# Altium footprint library standard.PcbLib: 229 footprints (part 10 of 15)
Each footprint in its own frame and in the unit in brackets; x right, y up, seen from the top. Pads: shape width x height; smd on the part's side, far side on the other; paste and mask are expansions set on the pad; w line width, h text height; cw(c..) or ccw(c..) is an arc to the next point about the centre after c.
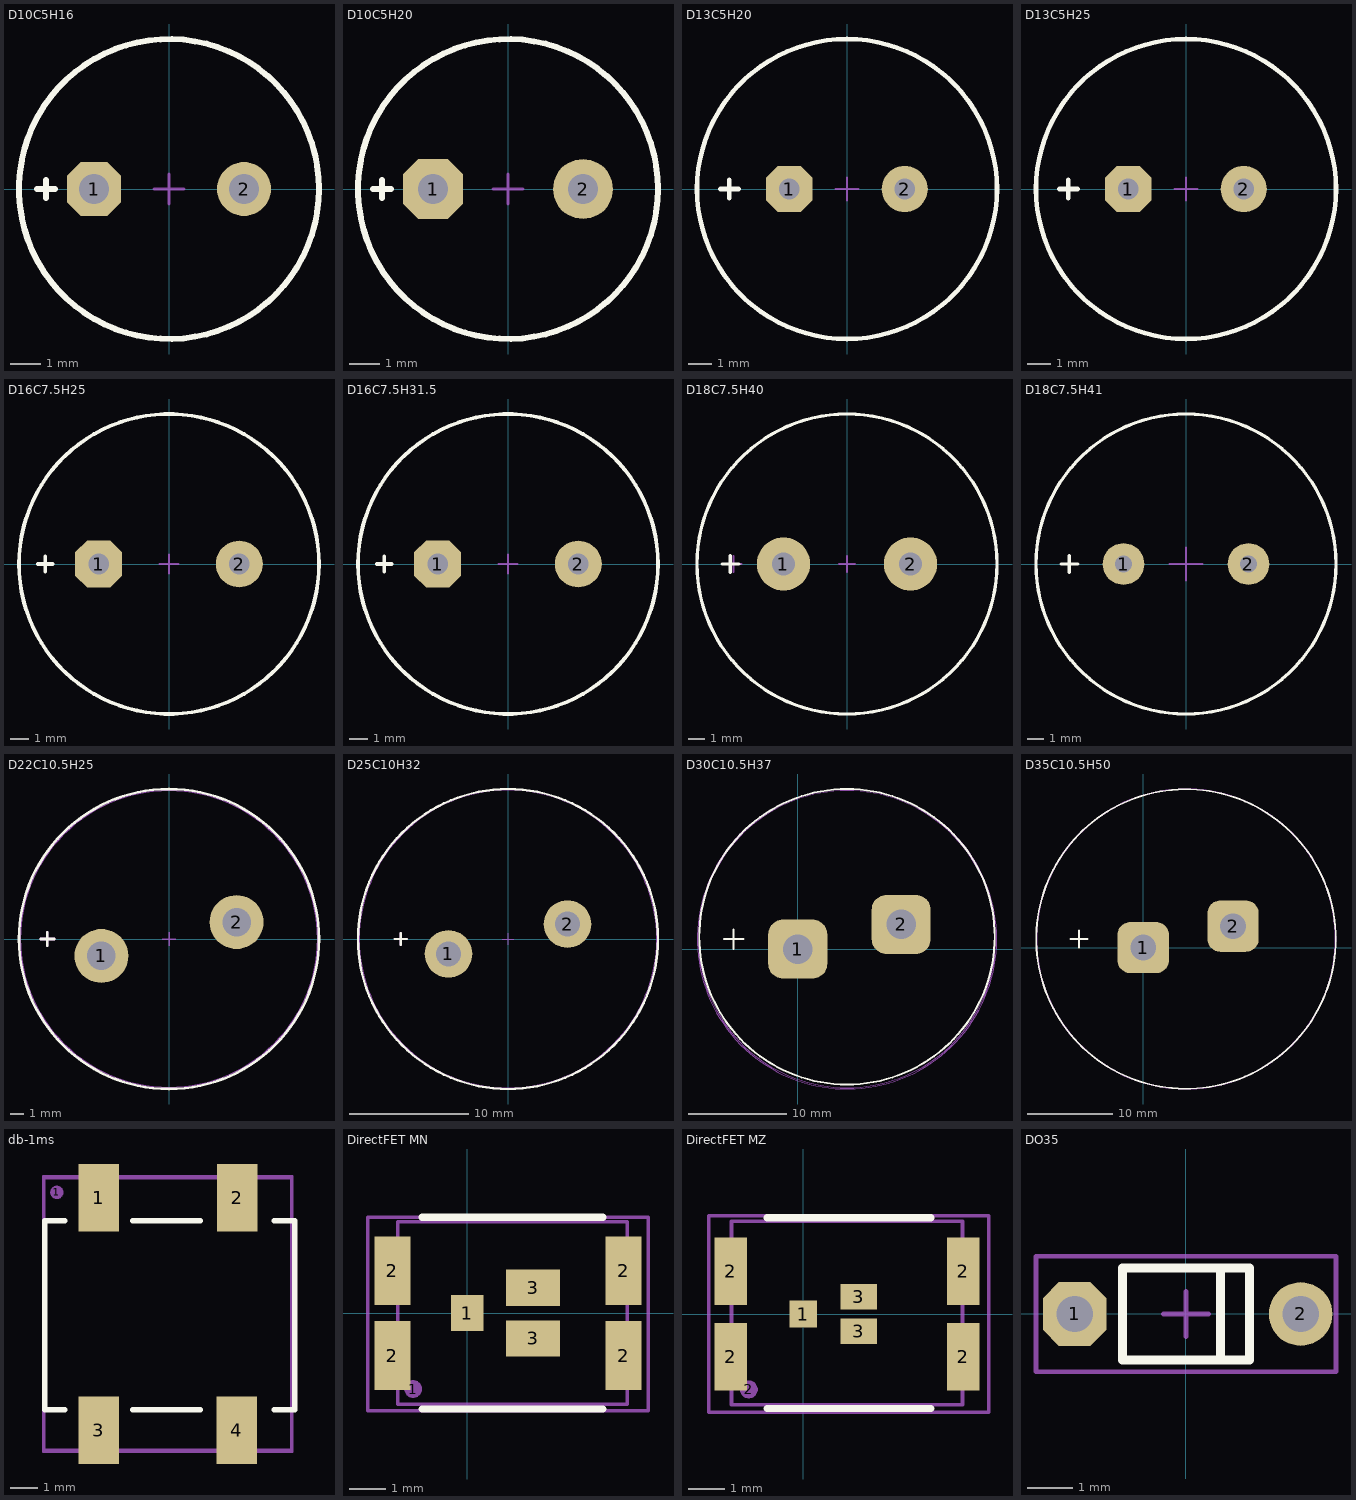
[diagram p9: the footprints below, top view; thin cyan lines are the x and y axes]

## D10C5H16 [mm] "Polar capacitor, diameter 10 mm, leads clearance 5 mm, height 16 mm"
height 16
pads (2):
  oct 1.8x1.8 hole 1: 1(-2.5,0)
  round 1.8 hole 1: 2(2.5,0)
Top Overlay:
  circle w0.2: c0,0 r5
  lines w0.2: -4.4,0 -3.8,0 ; -4.1,-0.3 -4.1,0.3
Mechanical 1:
  circle w0.1: c0,0 r5
Mechanical 15:
  circle w0.1: c0,0 r5
  lines w0.1: -0.5,0 0.5,0 ; 0,-0.5 0,0.5
3D body "User Library-CapAluRadial_D100H160.STEP": height 17.5, standoff -3, extent -5.25,-5.249 5.25,5.249

## D10C5H20 [mm] "Polar capacitor, diameter 10 mm, leads clearance 5 mm, height 20 mm"
height 20
pads (2):
  oct 2x2 hole 1: 1(-2.5,0)
  round 2 hole 1: 2(2.5,0)
Top Overlay:
  circle w0.2: c0,0 r5
  lines w0.2: -4.5,0 -3.9,0 ; -4.2,-0.3 -4.2,0.3
Mechanical 1:
  circle w0.1: c0,0 r5
Mechanical 15:
  circle w0.1: c0,0 r5
  lines w0.1: -0.5,0 0.5,0 ; 0,-0.5 0,0.5
3D body "User Library-CapAluRadial_D100H200.STEP": height 22, standoff -3, extent -5.25,-5.249 5.25,5.249

## D13C5H20 [mm] "Polar capacitor, diameter 13 mm, leads clearance 5 mm, height 20 mm"
height 20
pads (2):
  oct 2x2 hole 0.9: 1(-2.5,0)
  round 2 hole 0.9: 2(2.5,0)
Top Overlay:
  circle w0.2: c0,0 r6.5
  lines w0.2: -5.5,0 -4.7,0 ; -5.1,-0.4 -5.1,0.4
Mechanical 1:
  circle w0.1: c0,0 r6.5
Mechanical 15:
  circle w0.1: c0,0 r6.5
  lines w0.1: -0.5,0 0.5,0 ; 0,-0.5 0,0.5
3D body "User Library-Cap-EL(13x25-5).STEP": height 25, standoff -3.3, extent -6.5,-6.499 6.502,6.499

## D13C5H25 [mm] "Polar capacitor, diameter 13 mm, leads clearance 5 mm, height 25 mm"
height 25
pads (2):
  oct 2x2 hole 0.9: 1(-2.5,0)
  round 2 hole 0.9: 2(2.5,0)
Top Overlay:
  circle w0.2: c0,0 r6.5
  lines w0.2: -5.5,0 -4.7,0 ; -5.1,-0.4 -5.1,0.4
Mechanical 1:
  circle w0.1: c0,0 r6.5
Mechanical 15:
  circle w0.1: c0,0 r6.5
  lines w0.1: -0.5,0 0.5,0 ; 0,-0.5 0,0.5
3D body "User Library-Cap-EL(13x25-5).STEP": height 25, standoff -3.3, extent -6.5,-6.499 6.502,6.499

## D16C7.5H25 [mm] "Polar capacitor, diameter 16 mm, leads clearance 7.5 mm, height 25 mm"
height 25
pads (2):
  oct 2.5x2.5 hole 1.1: 1(-3.75,0)
  round 2.5 hole 1.1: 2(3.75,0)
Top Overlay:
  circle w0.2: c0,0 r8
  lines w0.2: -7,0 -6.2,0 ; -6.6,-0.4 -6.6,0.4
Mechanical 1:
  circle w0.1: c0,0 r8
Mechanical 15:
  circle w0.1: c0,0 r8
  lines w0.1: -0.5,0 0.5,0 ; 0,-0.5 0,0.5
3D body "User Library-CapAluRadial_D160H250.STEP": height 27, standoff -3, extent -8.25,-8.249 8.25,8.249

## D16C7.5H31.5 [mm] "Polar capacitor, diameter 16 mm, leads clearance 7.5 mm, height 31.5 mm"
height 31.5
pads (2):
  oct 2.5x2.5 hole 1.1: 1(-3.75,0)
  round 2.5 hole 1.1: 2(3.75,0)
Top Overlay:
  circle w0.2: c0,0 r8
  lines w0.2: -7,0 -6.2,0 ; -6.6,-0.4 -6.6,0.4
Mechanical 1:
  circle w0.1: c0,0 r8
Mechanical 15:
  circle w0.1: c0,0 r8
  lines w0.1: -0.5,0 0.5,0 ; 0,-0.5 0,0.5
3D body "User Library-CapAluRadial_D160H315.STEP": height 33.5, standoff -3, extent -8.25,-8.25 8.25,8.249

## D18C7.5H40 [mm]
height 40
pads (2):
  round 3.2 hole 1.4: 1(-3.81,0) 2(3.81,0)
Top Overlay:
  circle w0.2: c0,0 r9
  lines w0.2: -7.5,0 -6.5,0 ; -7,-0.5 -7,0.5
Mechanical 1:
  circle w0.1: c0,0 r9
  lines w0.1: -7.31,0 -6.31,0 ; -6.81,-0.5 -6.81,0.5
Mechanical 15:
  circle w0.1: c0,0 r9
  lines w0.1: -0.5,0 0.5,0 ; 0,-0.5 0,0.5
3D body "User Library-Cap-EL(18x40-7_5)T.STEP": height 41, standoff -3, extent -9,-8.999 9.002,9

## D18C7.5H41 [mm] "Polar capacitor, diameter 16 mm, leads clearance 7.5 mm, height 31.5 mm"
height 31.5
pads (2):
  round 2.5 hole 1: 1(-3.75,0) 2(3.75,0)
Top Overlay:
  circle w0.2: c0,0 r9
  lines w0.2: -7.5,0 -6.5,0 ; -7,-0.5 -7,0.5
Mechanical 1:
  circle w0.1: c0,0 r9
Mechanical 15:
  circle w0.1: c0,0 r9
  lines w0.1: -1,0 1,0 ; 0,-1 0,1
3D body "Cap electrolitic radial 18x41.STEP": height 41.3, standoff -1.2, extent -8.997,-8.999 8.997,9

## D22C10.5H25 [mm]
height 25
pads (2):
  round 4 hole 2.1: 1(-5,-1.25) 2(5,1.25)
Top Overlay:
  circle w0.2: c0,0 r11.1
  lines w0.2: -9.5,0 -8.5,0 ; -9,-0.5 -9,0.5
Mechanical 1:
  circle w0.1: c0,0 r11
  lines w0.2: -9.5,0 -8.5,0 ; -9,-0.5 -9,0.5
Mechanical 15:
  circle w0.1: c0,0 r11
  lines w0.1: -0.5,0 0.5,0 ; 0,-0.5 0,0.5
3D body "User Library-ECEC2DP271BJ.STEP": height 25, standoff 0, extent -11,-11 11,11

## D25C10H32 [mm]
height 25
pads (2):
  round 4 hole 2.1: 1(-5,-1.25) 2(5,1.25)
Top Overlay:
  circle w0.2: c0,0 r12.6
  lines w0.2: -9.5,0 -8.5,0 ; -9,-0.5 -9,0.5
Mechanical 1:
  circle w0.1: c0,0 r12.5
  lines w0.2: -9.5,0 -8.5,0 ; -9,-0.5 -9,0.5
Mechanical 15:
  circle w0.1: c0,0 r12.5
  lines w0.1: -0.5,0 0.5,0 ; 0,-0.5 0,0.5
3D body "D25H32.STEP": height 37.87, standoff 0.06, extent -13,-13 13,12.991

## D30C10.5H37 [mm]
height 37
pads (2):
  rrect50% 6x6 hole 3: 1(0,0) 2(10.5,2.5)
Top Overlay:
  circle w0.2: c5,1.25 r15
  lines w0.2: -7.5,1 -5.5,1 ; -6.5,0 -6.5,2
Mechanical 1:
  circle w0.1: c5,1 r15.207
  lines w0.1: -7.5,1 -5.5,1 ; -6.5,0 -6.5,2
Mechanical 15:
  circle w0.1: c5,1 r15.075
3D body "User Library-Assy_CE_R400_D1200_H1450.STEP": height 36.83, standoff -6.89, extent -12.7,-16.473 22.61,18.836

## D35C10.5H50 [mm]
height 50
pads (2):
  rrect50% 6x6 hole 3: 1(0,0) 2(10.5,2.5)
Top Overlay:
  circle w0.2: c5,1 r17.5
  lines w0.2: -8.5,1 -6.5,1 ; -7.5,0 -7.5,2
Mechanical 1:
  circle w0.1: c5,1 r17.464
  lines w0.1: -8.5,1 -6.5,1 ; -7.5,0 -7.5,2
Mechanical 15:
  circle w0.1: c5,1 r17.529
3D body "User Library-el_cap_470uF-400V.STEP": height 46.7, standoff -3.5, extent -15.756,-19.756 25.756,21.756

## db-1ms [mm]
pads (5):
  round 0.5 on Mech1: 1(3.2,-3.2)
  rect 1.5x2.5 smd: 1(4.75,-3.4) 2(9.875,-3.4) 3(4.75,-12) 4(9.85,-12)
Top Overlay:
  lines w0.2: 3.5,-11.25 2.75,-11.25 2.75,-4.25 3.5,-4.25 ; 6,-11.25 8.5,-11.25 ; 6,-4.25 8.5,-4.25 ; 11.25,-11.25 12,-11.25 12,-4.25 11.25,-4.25
Mechanical 1:
  lines w0.1: 2.725,-12.725 11.875,-12.725 11.875,-2.675 2.725,-2.675 2.725,-12.725
Mechanical 15:
  lines w0.1: 2.7,-12.8 2.7,-2.6 11.9,-2.6 11.9,-12.8 2.7,-12.8
3D body "User Library-DB-1S.STEP": height 3.4, standoff 0, extent 2.725,-12.725 11.875,-2.675

## DirectFET MN [mm]
pads (8):
  round 0.5 on Mech1: 1(-1.5,-2.1)
  rect 0.9x1 smd: 1(0,0)
  rect 1x1.9 smd: 2(-2.075,-1.175) 2(-2.075,1.175) 2(4.325,-1.175) 2(4.325,1.175)
  rect 1.5x1 smd: 3(1.82,-0.7) 3(1.82,0.7)
Top Overlay:
  lines w0.2: -1.25,-2.65 3.75,-2.65 ; -1.25,2.65 3.75,2.65
Mechanical 1:
  lines w0.1: -1.925,-2.525 -1.925,2.525 4.425,2.525 4.425,-2.525 -1.925,-2.525
Mechanical 15:
  lines w0.1: -2.75,-2.7 -2.75,2.65 5,2.65 5,-1.5 5,-2.7 -2.75,-2.7
3D body "User Library-DirectFET_MX.STEP": height 0.75, standoff 0, extent -1.925,-2.525 4.425,2.525

## DirectFET MZ [mm]
pads (8):
  rect 0.75x0.75 smd: 1(0,0)
  rrect0% 0.9x1.85 smd: 2(-2,-1.175) 2(-2,1.175) 2(4.4,-1.175) 2(4.4,1.175)
  round 0.5 on Mech1: 2(-1.5,-2.075)
  rect 1x0.7 smd: 3(1.525,-0.475) 3(1.525,0.475)
Top Overlay:
  lines w0.2: -1,-2.6 3.5,-2.6 ; -1,2.65 3.5,2.65
Mechanical 1:
  lines w0.1: -1.975,-2.5 -1.975,2.55 4.375,2.55 4.375,-2.5 -1.975,-2.5
Mechanical 15:
  lines w0.1: -2.6,-2.7 5,-2.7 5.1,-2.7 5.1,2.7 -2.6,2.7 -2.6,-2.7
3D body "User Library-DirectFET_MX.STEP": height 0.75, standoff 0, extent -1.975,-2.5 4.375,2.55

## DO35 [mm]
height 3
pads (2):
  oct 1.4x1.4 hole 0.8: 1(-2.45,0)
  round 1.4 hole 0.8: 2(2.525,0)
Top Overlay:
  lines w0.2: 0.762,-1.016 0.762,1.016 ; -1.397,-1.016 -1.397,1.016 1.397,1.016 1.397,-1.016 -1.397,-1.016
Mechanical 1:
  lines w0.1: 0.762,-1.016 0.762,1.016 ; -1.397,-1.016 1.397,-1.016 1.397,1.016 -1.397,1.016 -1.397,-1.016
Mechanical 15:
  lines w0.1: -0.5,0 0.5,0 ; 0,-0.5 0,0.5 ; -3.302,-1.27 -3.302,1.27 3.302,1.27 3.302,-1.27 -3.302,-1.27
3D body "DO-35.step": height 2.75, standoff -1.35, extent -2.7,-0.75 2.8,0.75